# Altium footprint library ALTİUM_PROJE.PcbLib1.PcbLib: 38 footprints (part 2 of 3)
Each footprint in its own frame and in the unit in brackets; x right, y up, seen from the top. Pads: shape width x height; smd on the part's side, far side on the other; paste and mask are expansions set on the pad; w line width, h text height; cw(c..) or ccw(c..) is an arc to the next point about the centre after c.
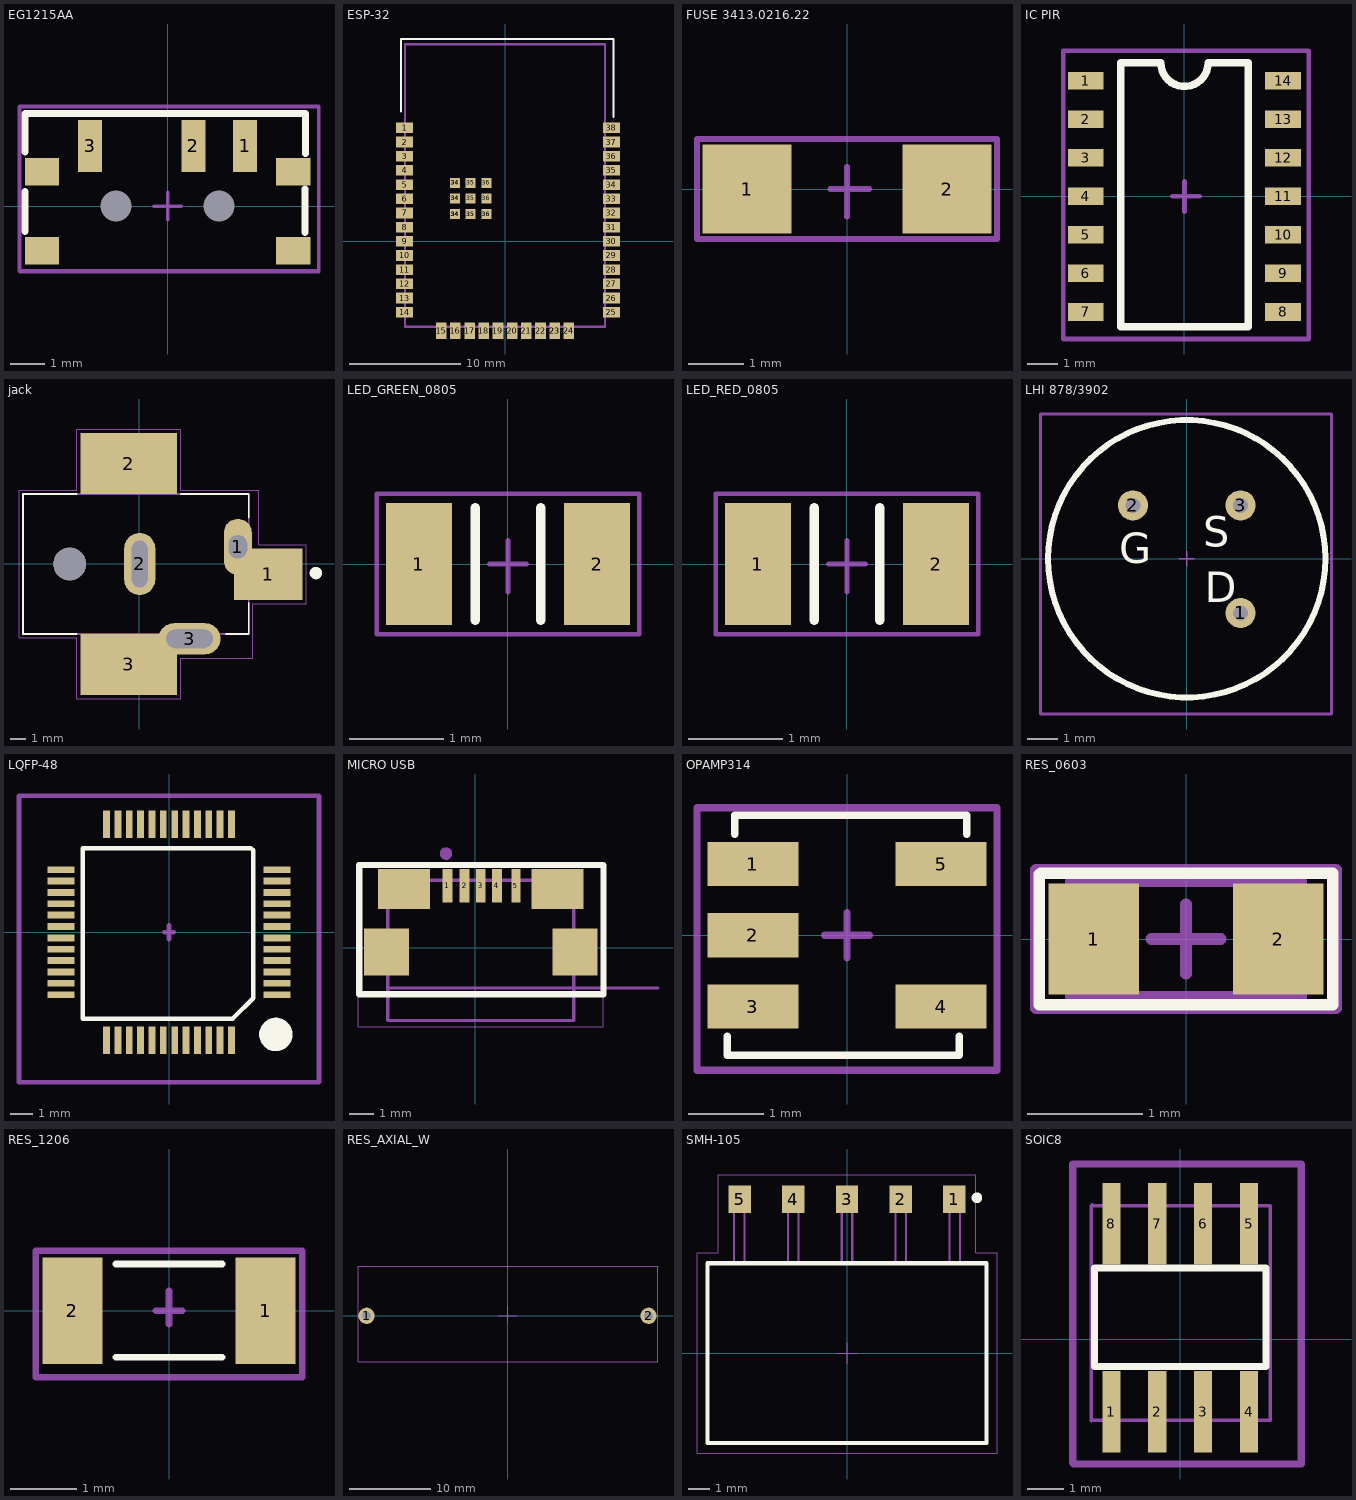
[diagram p1: the footprints below, top view; thin cyan lines are the x and y axes]

## EG1215AA [mm]
pads (9):
  rect 0.7x1.5 smd mask+0.05: 1(2.25,1.75) 2(0.75,1.75) 3(-2.25,1.75)
  rect 1x0.8 smd mask+0.05: ""(-3.65,-1.3) ""(-3.65,1) ""(3.65,-1.3) ""(3.65,1)
  rect 0x0 hole 0.9 mask+0.05: ""(-1.5,0) ""(1.5,0)
Top Overlay:
  lines w0.2: -4.14,-0.737 -4.14,0.432 ; -4.14,1.575 -4.14,2.692 4.013,2.692 4.013,1.524 ; 3.988,-0.762 3.988,0.508
Top Component Center:
  lines w0.1: -0.4,0 0.4,0 ; 0,-0.4 0,0.4 ; -4.318,-1.88 -4.318,2.896 4.216,2.896 4.394,2.896 4.394,-1.88 -4.318,-1.88
Top Designator:
  lines w0.1: -4.3,-1.9 -4.3,2.9 4.4,2.9 4.4,-1.9 -4.3,-1.9
  text "DESİGNER" at -0.1,0.4 h1
3D body "EG1215AA--3DModel-STEP-1.STEP": height 1.4, standoff -0.3, extent -3.87,-2.74 3.83,2.16

## ESP-32 [mm]
pads (59):
  rect 1.5x0.95 smd mask+0.05: 1(-9,10.16) 2(-9,8.89) 3(-9,7.62) 4(-9,6.35) 5(-9,5.08) 6(-9,3.81) 7(-9,2.54) 8(-9,1.27) 9(-9,0) 10(-9,-1.27) 11(-9,-2.54) 12(-9,-3.81) 13(-9,-5.08) 14(-9,-6.35) 25(9.525,-6.35) 26(9.525,-5.08) 27(9.525,-3.81) 28(9.525,-2.54) 29(9.525,-1.27) 30(9.525,0) 31(9.525,1.27) 32(9.525,2.54) 33(9.525,3.81) 34(9.525,5.08) 35(9.525,6.35) 36(9.525,7.62) 37(9.525,8.89) 38(9.525,10.16)
  rect 0.95x1.5 smd mask+0.05: 15(-5.715,-8) 16(-4.445,-8) 17(-3.175,-8) 18(-1.905,-8) 19(-0.635,-8) 20(0.635,-8) 21(1.905,-8) 22(3.175,-8) 23(4.445,-8) 23(4.445,-8) 24(5.715,-8)
  rect 0.9x0.9 smd mask+0.05: 34(-4.48,2.44) 34(-4.48,2.44) 34(-4.48,2.44) 34(-4.48,2.44) 34(-4.48,2.44) 34(-4.48,2.44) 34(-4.48,3.84) 34(-4.48,3.84) 34(-4.48,3.84) 34(-4.48,5.24) 34(-4.48,5.24) 34(-4.48,5.24) 35(-3.08,2.44) 35(-3.08,2.44) 35(-3.08,3.84) 35(-3.08,5.24) 36(-1.68,2.44) 36(-1.68,2.44) 36(-1.68,3.84) 36(-1.68,5.24)
Top Overlay:
  lines w0.2: -9.32,11.64 -9.32,18.12 9.72,18.12 9.72,11.16
Bottom 3D Body:
  lines w0.2: 8.923,-7.66 4.397,-7.66 -4.657,-7.66 -8.96,-7.66 -8.96,17.651 8.943,17.651 8.943,-7.66
3D body "ESP-32 .step": height 2.61, standoff -0.1, extent -8.85,-7.67 9.05,17.73

## FUSE 3413.0216.22 [mm]
pads (2):
  rect 1.6x1.6 smd mask+0.05: 1(-1.8,0) 2(1.8,0)
Top Component Center:
  lines w0.1: -0.3,0 0.4,0 ; 0,-0.5 0,0.4 ; -2.7,-0.9 2.7,-0.9 2.7,-0.45 2.7,0.45 2.7,0.9 -2.7,0.9 -2.7,-0.9
Top Designator:
  lines w0.1: -2.7,-0.9 2.7,-0.9 2.7,0.9 -2.7,0.9 -2.7,-0.9
  text "Designator" at -0.4,-0.067 h1
3D body "e_0100.3479_003.step": height 0, standoff -0.64, extent -1.712,-0.8 1.512,0.8

## IC PIR [mm]
pads (14):
  rect 1.18x0.58 smd mask+0.05: 1(-3.25,3.81) 2(-3.25,2.54) 3(-3.25,1.27) 4(-3.25,0) 5(-3.25,-1.27) 6(-3.25,-2.54) 7(-3.25,-3.81) 8(3.25,-3.81) 9(3.25,-2.54) 10(3.25,-1.27) 11(3.25,0) 12(3.25,1.27) 13(3.25,2.54) 14(3.25,3.81)
Top Overlay:
  lines w0.25: -2.1,-4.3 -2.1,4.4 -0.781,4.4 ccw(c0,4.4) 0.781,4.4 2.1,4.4 2.1,-4.3 -2.1,-4.3
Top Component Center:
  lines w0.15: -0.4,0 0.5,0 ; 0,-0.5 0,0.5 ; -4,-4.7 4.1,-4.7 4.1,4.8 -4,4.8 -4,-4.7
Top Designator:
  lines w0.15: -4,-4.7 -4,4.8 4.1,4.8 4.1,-4.7 -4,-4.7
  text "DESİGNER" at -0.7,1.7 h1
3D body "User Library-so14-1.step": height 1.7, standoff 0, extent -3,-4.4 3,4.4

## jack [mm]
pads (7):
  oval 1.8x3.6 hole 1.2 slot 1.5 at 90 deg: 1(6.325,1.1)
  rect 4.4x3.3 smd mask+0.05: 1(8.275,-0.65)
  rect 6.2x3.9 smd mask+0.05: 2(-0.675,6.45) 3(-0.675,-6.45)
  oval 2x4 hole 1 slot 3 at 90 deg: 2(0.025,0)
  oval 4x2 hole 1.2 slot 3 at 0 deg: 3(3.225,-4.8)
  round 2.1 hole 2.1 unplated: ""(-4.475,0)
Top Overlay:
  circle w0.4: c11.335,-0.58 r0.2
  lines w0.127: -4.025,-4.5 -7.475,-4.5 -7.475,4.5 -4.025,4.5 ; 2.675,4.5 7.025,4.5 7.025,3 ; 5.575,-4.5 7.025,-4.5 7.025,-2.5
Mechanical 13:
  lines w0.127: -7.475,-4.5 7.025,-4.5 7.025,4.5 -7.475,4.5 -7.475,-4.5
Mechanical 15:
  lines w0.05: -7.725,-4.75 -4.025,-4.75 -4.025,-8.65 2.675,-8.65 2.675,-6.05 7.275,-6.05 7.275,-2.55 10.725,-2.55 10.725,1.25 7.675,1.25 7.675,4.75 2.675,4.75 2.675,8.65 -4.025,8.65 -4.025,4.75 -7.725,4.75 -7.725,-4.75
3D body "CUI_DEVICES_PJ-037AH-SMT-TR.step": height 11.2, standoff -3.2, extent -7.483,-7.595 9.617,7.605

## LED_GREEN_0805 [mm]
pads (2):
  rect 0.7x1.3 smd mask+0.05: 1(-0.95,0) 2(0.95,0)
Top Overlay:
  lines w0.1: -0.35,-0.6 -0.35,0.6 ; 0.35,-0.6 0.35,0.6
Top Component Center:
  lines w0.05: -0.2,0 0.2,0 0,0 ; 0,-0.3 0,0.25 ; -1.4,-0.75 1.4,-0.75 1.4,0.75 -1.35,0.75 -1.4,0.75 -1.4,-0.75
Top Designator:
  lines w0.05: -1.4,-0.75 1.4,-0.75 1.4,0.75 -1.4,0.75 -1.4,-0.75
  text "DESİGNER" at -0.25,0.05 h0.5
3D body "User Library-LED1206G.STEP": height 1.11, standoff -0.4, extent -1.6,-0.8 1.6,0.8

## LED_RED_0805 [mm]
pads (2):
  rect 0.7x1.3 smd mask+0.05: 1(-0.95,0) 2(0.95,0)
Top Overlay:
  lines w0.1: -0.35,-0.6 -0.35,0.6 ; 0.35,-0.6 0.35,0.6
Top Component Center:
  lines w0.05: -0.2,0 0.2,0 0,0 ; 0,-0.3 0,0.25 ; -1.4,-0.75 1.4,-0.75 1.4,0.75 -1.35,0.75 -1.4,0.75 -1.4,-0.75
Top Designator:
  lines w0.05: -1.4,-0.75 1.4,-0.75 1.4,0.75 -1.4,0.75 -1.4,-0.75
  text "DESİGNER" at -0.25,0.05 h0.5
3D body "User Library-LED1206R.STEP": height 1.11, standoff -0.4, extent -1.6,-0.8 1.6,0.8

## LHI 878/3902 [mm]
pads (3):
  round 1 hole 0.5 mask+0.05: 1(1.785,-1.8) 2(-1.785,1.771) 3(1.785,1.771)
Top Overlay:
  circle w0.2: c0,0 r4.6
  text "G" at -2.246,-0.146 h1
  text "S" at 0.554,0.404 h1
  text "D" at 0.604,-1.446 h1
Top Component Center:
  lines w0.05: -0.25,0 0.25,0 ; 0,-0.25 0,0.25
  lines w0.1: -4.85,-5.15 -4.85,4.8 -2.3,4.8 2.3,4.8 4.8,4.8 4.8,-5.15 -4.85,-5.15
Top Designator:
  text "DESİGNER" at 0.254,-1.096 h1
3D body "User Library-LHI878.step": height 4.7, standoff -2.3, extent -4.6,-5.029 4.6,4.6

## LQFP-48 [mm] "7mm*7mm"
pads (50):
  rect 0.3x1.2 smd mask+0.05: 1(2.75,-4.75) 2(2.25,-4.75) 3(1.75,-4.75) 4(1.25,-4.75) 5(0.75,-4.75) 6(0.25,-4.75) 7(-0.25,-4.75) 8(-0.75,-4.75) 9(-1.25,-4.75) 10(-1.75,-4.75) 11(-2.25,-4.75) 12(-2.75,-4.75) 25(-2.75,4.75) 26(-2.25,4.75) 27(-1.75,4.75) 28(-1.25,4.75) 29(-0.75,4.75) 30(-0.25,4.75) 31(0.25,4.75) 32(0.75,4.75) 33(1.25,4.75) 34(1.75,4.75) 35(2.25,4.75) 36(2.75,4.75) 36(2.75,4.75)
  rect 1.2x0.3 smd mask+0.05: 13(-4.75,-2.75) 14(-4.75,-2.25) 15(-4.75,-1.75) 16(-4.75,-1.25) 17(-4.75,-0.75) 18(-4.75,-0.25) 19(-4.75,0.25) 20(-4.75,0.75) 21(-4.75,1.25) 22(-4.75,1.75) 23(-4.75,2.25) 23(-4.75,2.25) 24(-4.75,2.75) 37(4.75,2.75) 38(4.75,2.25) 39(4.75,1.75) 40(4.75,1.25) 41(4.75,0.75) 42(4.75,0.25) 43(4.75,-0.25) 44(4.75,-0.75) 45(4.75,-1.25) 46(4.75,-1.75) 47(4.75,-2.25) 48(4.75,-2.75)
Top Overlay:
  circle w0.75: c4.7,-4.5 r0.361
  lines w0.2: -3.8,-3.8 2.8,-3.8 3.7,-2.9 3.7,3.6 3.6,3.7 -3.8,3.7 -3.8,-3.8
Top Component Center:
  lines w0.2: -0.2,0 0.2,0 ; 0,-0.3 0,0.3 ; -6.6,-6.6 6.6,-6.6 6.6,6 6.4,6 -6.6,6 -6.6,-6.6
Top Designator:
  text ".Designator" at -15.218,-0.408 h1.52
3D body "STM32-LQFP48.SLDPRT": height -1.4, standoff -2.9, extent -4.46,-4.55 4.54,4.45

## MICRO USB [mm]
pads (9):
  rect 0.4x1.35 smd mask+0.05: 1(-1.118,2.489) 2(-0.421,2.489) 3(0.229,2.489) 4(0.879,2.489)
  rect 0.375x1.35 smd mask+0.05: 5(1.651,2.489)
  rect 1.8x1.9 smd mask+0.05: ""(-3.571,-0.186) ""(4.029,-0.186)
  rect 2.1x1.6 smd mask+0.05: ""(-2.871,2.364) ""(3.329,2.364)
Top Overlay:
  lines w0.25: -4.674,-1.88 -4.674,3.327 5.182,3.327 5.182,2.026 5.182,-0.578 5.182,-1.88 -4.674,-1.88
Mechanical 13:
  circle w0.3: c-1.171,3.789 r0.1
  lines w0.127: 7.379,-1.636 3.979,-1.636 ; -3.521,-1.636 -3.521,-2.947 3.979,-2.947 3.979,-1.636 ; -3.521,-1.636 -3.521,2.714 3.979,2.714 3.979,-1.636 ; -3.521,-1.636 3.979,-1.636
  text "PCB Edge" at 5.434,-1.415 h0.81
Mechanical 15:
  lines w0.05: -4.721,-3.197 5.179,-3.197 5.179,3.414 -4.721,3.414 -4.721,-3.197
3D body "10118192-0001LF--3DModel-STEP-533217.STEP": height 2.74, standoff -0.27, extent -3.677,-2.54 4.236,3.121

## OPAMP314 [mm]
pads (5):
  rect 1.21x0.59 smd mask+0.05: 1(-1.255,0.95) 2(-1.255,0) 3(-1.255,-0.95) 4(1.255,-0.95) 5(1.255,0.95)
Top Overlay:
  lines w0.1: -1.598,-1.348 -1.598,-1.6 -1.6,-1.6 1.5,-1.6 1.5,-1.344 ; -1.5,1.344 -1.5,1.6 1.6,1.6 1.598,1.6 1.598,1.348
Top Component Center:
  lines w0.1: -0.3,0 0.3,0 ; 0,-0.3 0,0.3 ; -2,-1.8 2,-1.8 2,1.7 -2,1.7 -2,-1.8
Top Designator:
  lines w0.1: -2,-1.8 2,-1.8 2,1.7 -2,1.7 -2,-1.8
  text "DESİGNER" at -1.1,0.5 h1
3D body "OPA314AIDBVR.STEP": height 1.45, standoff 0, extent -1.4,-1.45 1.4,1.45

## RES_0603 [mil]
pads (2):
  rect 31x38 smd mask+1.97: 1(-31.5,0) 2(31.5,0)
Top Overlay:
  lines w3.94: -50.04,22.02 -50.04,-22.48 50.04,-22.48 50.04,22.48 -49.58,22.48
Bottom 3D Body:
  lines w3.94: -39.37,-19.68 -39.37,19.68 39.37,19.68 39.37,-19.68 -39.37,-19.68
  text "DENGİNATOR" at 3.94,-7.87 h9.45
Top Component Center:
  lines w3.94: -11.81,0 11.81,0 ; 0,-11.81 0,11.81 ; -51.18,-23.62 -51.18,23.62 51.18,23.62 51.18,-23.62 -51.18,-23.62
Top Designator:
  lines w3.94: -51.18,-23.62 -51.18,23.62 51.18,23.62 51.18,-23.62 -51.18,-23.62
3D body "0603S1.STEP": height -1.14, standoff -18.86, extent -38.92,-19.68 38.92,18.88

## RES_1206 [mm]
pads (2):
  rect 0.9x1.6 smd mask+0.05: 1(1.45,0) 2(-1.45,0)
Top Overlay:
  lines w0.1: -0.8,-0.7 0.8,-0.7 ; -0.8,0.7 0.8,0.7
Top Component Center:
  lines w0.1: -0.2,0 0.2,0 ; 0,-0.2 0,0.3 ; -2,-1 2,-1 2,0.9 -2,0.9 -2,-1
Top Designator:
  lines w0.1: -2,-1 2,-1 2,0.9 -2,0.9 -2,-1
  text "'.Designator'İNPUT" at -0.7,-0.033 h0.5
3D body "res1206r.STEP": height 0, standoff -0.55, extent -1.984,-0.976 1.984,0.9

## RES_AXIAL_W [mm]
pads (2):
  round 2 hole 1.1 mask+0.05: 1(-17.25,0) 2(17.25,0)
Top Component Center:
  lines w0.1: -1.15,0 1.15,0 ; 0,-0.85 0,1.2 ; -18.3,-5.6 18.35,-5.6 18.35,6.05 -18.3,6.05 -18.3,-5.6
Top Designator:
  lines w0.1: -18.3,-5.6 18.35,-5.6 18.35,6.05 18.4,6.05 -18.3,6.05 -18.3,-5.6
  text "Designator" at 0.2,0.766 h2
3D body: height 4.4, standoff 3.6, extent 8.5,-0.4 17.5,0.4
3D body: height 4.35, standoff -4.65, extent -17.65,-0.4 -16.85,0.4
3D body: height 9.75, standoff 0, extent -11,-4.8 11,4.8
3D body: height 4.4, standoff 3.6, extent -17.5,-0.4 -8.5,0.4
3D body: height 4.35, standoff -4.65, extent 16.85,-0.4 17.65,0.4

## SMH-105 [mm]
pads (5):
  rect 1.05x1.3 smd mask+0.05: 1(5.08,7.29) 2(2.54,7.29) 3(0,7.29) 4(-2.54,7.29) 5(-5.08,7.29)
Top Overlay:
  circle w0.25: c6.15,7.35 r0.125
  lines w0.2: -6.6,-4.25 6.6,-4.25 6.6,4.25 -6.6,4.25 -6.6,-4.25
Mechanical 12:
  lines w0.001: -6.6,-4.25 6.6,-4.25 6.6,4.25 -6.6,4.25 -6.6,-4.25
Mechanical 13:
  lines w0.1: -5.35,4.25 -5.35,7.62 -4.85,7.62 -4.85,4.25 ; -2.8,4.25 -2.8,7.62 -2.3,7.62 -2.3,4.25 ; -0.25,4.25 -0.25,7.62 0.25,7.62 0.25,4.25 ; 2.3,4.25 2.3,7.62 2.8,7.62 2.8,4.25 ; 4.85,4.25 4.85,7.62 5.35,7.62 5.35,4.25 ; -6.6,-4.25 6.6,-4.25 6.6,4.25 -6.6,4.25 -6.6,-4.25
  text ".Designator" at 0,-0.127 h1.52
Mechanical 15:
  lines w0.05: -0.5,0 0.5,0 ; 0,-0.5 0,0.5 ; -7.1,-4.75 7.1,-4.75 7.1,4.75 6.1,4.75 6.1,8.45 -6.1,8.45 -6.1,4.75 -7.1,4.75 -7.1,-4.75
3D body "SMH-105-02-L-S.stp": height 2.41, standoff -0.01, extent -6.629,-4.623 6.579,7.315

## SOIC8 [mm]
pads (8):
  rect 0.5x2.25 smd mask+0.05: 1(-1.905,-2) 2(-0.635,-2) 3(0.635,-2) 4(1.905,-2) 5(1.905,3.2) 6(0.635,3.2) 7(-0.635,3.2) 8(-1.905,3.2)
Top Overlay:
  lines w0.2: -2.375,-0.75 -2.375,1.975 2.375,1.975 2.375,-0.75 -2.375,-0.75
Top Component Center:
  lines w0.2: -2.975,4.8 -2.975,-3.425 -2.95,-3.45 3.35,-3.45 3.35,4.85 -2.975,4.85
Top Designator:
  text "DENGİNATOR" at 2.446,-0.646 h1
Bottom Designator:
  lines w0.1: -2.439,3.715 -2.456,3.697 -2.456,-2.252 -2.444,-2.24 2.488,-2.24 2.488,3.698 -2.431,3.698
3D body "?????? ????? acs711klctr-25ab-t .STEP": height 1.9, standoff 0.01, extent -2.45,-2.275 2.45,3.725